# Altium footprint library Lib_001.PcbLib: 429 footprints (part 1 of 28)
Each footprint in its own frame and in the unit in brackets; x right, y up, seen from the top. Pads: shape width x height; smd on the part's side, far side on the other; paste and mask are expansions set on the pad; w line width, h text height; cw(c..) or ccw(c..) is an arc to the next point about the centre after c.
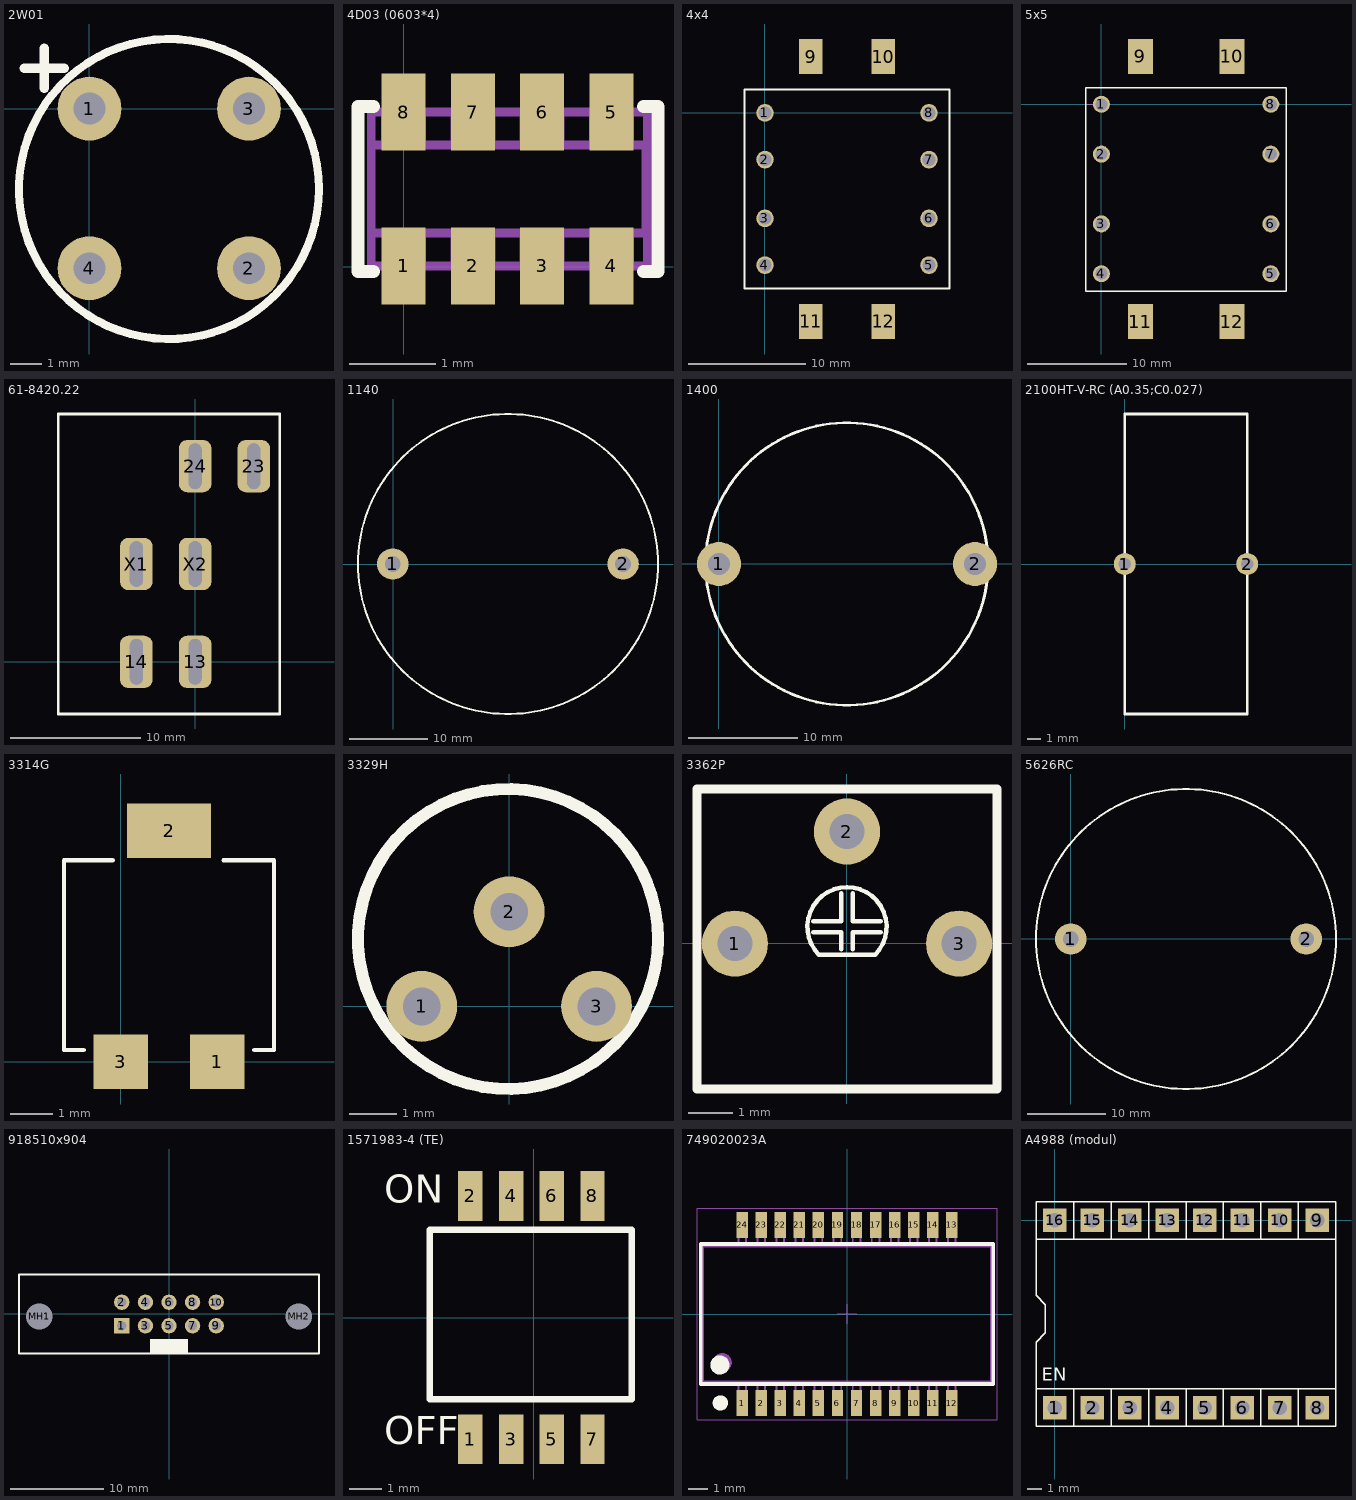
[diagram p0: the footprints below, top view; thin cyan lines are the x and y axes]

## 2W01 [mm] "Single-Phase Bridge Rectifier"
pads (4):
  round 2 hole 1: 1(0,0) 2(5,-5) 3(5,0) 4(0,-5)
Top Overlay:
  circle w0.254: c2.494,-2.518 r4.7
  lines w0.3: -2.037,1.26 -0.787,1.26 ; -1.412,0.635 -1.412,1.885
3D body "2W01.stp": height 7.4, standoff -2.6, extent -1.997,-7.004 7.003,1.996

## 4D03 (0603*4) [mil]
pads (8):
  rect 20x35 smd: 1(-0.05,0.4) 2(31.45,0.4) 3(62.95,0.4) 4(94.45,0.4) 5(94.45,70.4) 6(62.95,70.4) 7(31.45,70.4) 8(-0.05,70.4)
Top Overlay:
  lines w6: -13.8,-2.1 -20.8,-2.1 -20.8,72.9 -13.8,72.9 ; 109.1,-2.1 115.6,-2.1 115.6,72.9 109.1,72.9
Mechanical 1:
  lines w2: -15.3,-0.6 -15.3,70.4 -9.3,70.4 -9.3,55.4 9.2,55.4 9.2,71.4 22.2,71.4 22.2,55.4 40.7,55.4 40.7,71.4 53.7,71.4 53.7,55.4 72.2,55.4 72.2,71.4 85.2,71.4 85.2,55.4 103.7,55.4 103.7,71.4 110.2,71.4 110.2,-0.6 103.7,-0.6 103.7,15.4 85.2,15.4 85.2,-0.6 72.2,-0.6 72.2,15.4 53.7,15.4 53.7,-0.6 40.7,-0.6 40.7,15.4 22.2,15.4 22.2,-0.6 9.2,-0.6 9.2,15.4 -8.8,15.4 -8.8,-0.6 -15.3,-0.6
  lines w4: -14.8,0.4 -9.3,0.4 -4.3,5.4 4.2,5.4 9.2,0.4 22.2,0.4 27.2,5.4 35.7,5.4 40.7,0.4 53.7,0.4 58.7,5.4 67.2,5.4 72.2,0.4 85.2,0.4 90.2,5.4 98.7,5.4 103.7,0.4 110.7,0.4 110.7,70.4 103.7,70.4 98.7,65.4 90.2,65.4 85.2,70.4 72.2,70.4 67.2,65.4 58.7,65.4 53.7,70.4 40.7,70.4 35.7,65.4 27.2,65.4 22.2,70.4 9.2,70.4 4.2,65.4 -4.3,65.4 -9.3,70.4 -14.8,70.4 -14.8,0.4 ; -14.8,15.4 110.2,15.4 110.2,55.4 -14.8,55.4 -14.8,15.4
3D body: height 11.81, standoff 0, extent -14.8,0.4 110.7,70.4
3D body: height 13.78, standoff 11.81, extent -14.8,15.4 110.2,55.4

## 4x4 [mm] "Каркас_Ш_4х4_односекционный"
pads (12):
  round 1.5 hole 1.1 unplated: 1(0,0) 2(0,-4) 3(0,-9) 4(0,-13) 5(14,-13) 6(14,-9) 7(14,-4) 8(14,0)
  rect 2x3 smd: 9(3.91,4.8) 10(10.09,4.8) 11(3.91,-17.8) 12(10.09,-17.8)
Top Overlay:
  lines w0.15: -1.75,-15 -1.75,2 0,2 15.75,2 15.75,-15 -1.75,-15
3D body: height 12.5, standoff 0, extent -1.75,-15 15.75,2

## 5x5 [mm] "Каркас_Ш_4х4_односекционный"
pads (12):
  round 1.7 hole 1.2 unplated: 1(0,0) 2(0,-5) 3(0,-12) 4(0,-17) 5(17,-17) 6(17,-12) 7(17,-5) 8(17,0)
  rect 2.5x3.5 smd: 9(3.91,4.8) 10(13.09,4.8) 11(3.91,-21.8) 12(13.09,-21.8)
Top Overlay:
  lines w0.15: -1.569,-18.736 -1.569,1.652 2.348,1.652 18.538,1.652 18.538,-18.736 -1.569,-18.736
Mechanical 1:
  lines w0.1: -1.5,0 0,0
3D body "TR-5x5.stp": height 16, standoff -4.05, extent -1.498,-18.698 18.502,1.602

## 61-8420.22 [mm] "button"
pads (6):
  rrect50% 2.5x4 hole 1 slot 3.5 at 90 deg: 13(0,0) 14(-4.5,0) 23(4.5,15) 24(0,15) X1(-4.5,7.5) X2(0,7.5)
Top Overlay:
  lines w0.2: 6.48,-4 -10.5,-4 -10.5,19 6.48,19 ; 6.5,-4 6.5,19

## 1140 [mm]
pads (2):
  round 4 hole 2: 1(-0.033,0) 2(29.21,0)
Top Overlay:
  circle w0.254: c14.6,0 r19.05
3D body "User Library-Inductor Bourns 1140 series.STEP": height 26.16, standoff -12.7, extent -4.45,-19.05 33.65,19.05

## 1400 [mm] "1400 Series Inductor"
height 14
pads (2):
  round 4 hole 2: 1(0,0) 2(23.3,0)
Top Overlay:
  circle w0.254: c11.633,0 r12.85
3D body "User Library-murata_1400.STEP": height 14.5, standoff -10, extent -1.017,-12.2 24.283,12.2

## 2100HT-V-RC (A0.35;C0.027) [mm]
pads (2):
  round 1.6 hole 0.9: 1(0,0) 2(8.9,0)
Top Overlay:
  lines w0.2: 0,-10.9 0,0 0,10.9 8.9,10.9 8.9,0 8.9,-10.9 0,-10.9
3D body "User Library-Inductor-20uH-5A.step": height 20.89, standoff -4, extent 0.689,-10.807 8.489,10.971

## 3314G [mm]
pads (3):
  rect 1.3x1.3 smd: 1(2.3,0) 3(0,0)
  rect 2x1.3 smd: 2(1.15,5.5)
Top Overlay:
  lines w0.1: -1.35,4.78 -1.35,0.28 -0.88,0.28 ; -1.35,4.8 -0.19,4.8 ; 2.45,4.8 3.65,4.8 3.65,0.28 3.18,0.28
3D body "3314g-1-101e.stp": height 2.77, standoff 0.04, extent -1.339,-0.369 3.66,5.829

## 3329H [mm]
height 5
pads (3):
  round 1.5 hole 0.8: 1(-1.85,-0.004) 2(0,2) 3(1.85,-0.004)
Top Overlay:
  circle w0.254: c-0.025,1.422 r3.175
3D body "User Library-3329H.step": height 4.57, standoff -1.5, extent -3.179,-1.614 3.171,4.736

## 3362P [mm]
height 5
pads (3):
  round 1.5 hole 0.8: 1(-2.54,-0.004) 2(0,2.536) 3(2.54,-0.004)
Top Overlay:
  lines w0.1: -0.762,0.25 -0.127,0.25 -0.127,-0.131 ; -0.762,0.504 -0.127,0.504 -0.127,1.139 ; 0.127,-0.131 0.127,0.25 0.762,0.25 ; 0.127,1.139 0.127,0.504 0.762,0.504 ; -0.635,-0.258 cw(c0,0.377) 0.635,-0.258 -0.635,-0.258
  lines w0.2: -3.4,-3.3 3.4,-3.3 3.4,3.5 -3.4,3.5 -3.4,-3.3
3D body "User Library-R_3362P.step": height 4.65, standoff -2.85, extent -3.3,-3.584 3.3,3.406

## 5626RC [mm]
pads (2):
  round 4 hole 2: 1(0,0) 2(29.9,0)
Top Overlay:
  circle w0.254: c14.633,0 r19.05
3D body "5626-rc.stp": height 38.05, standoff -25.45, extent -4.417,-19.05 33.683,19.05

## 918510x904 [mm] "Connector; IDC, Thru-Hole; 10 Position; Vertical; Pitch 2.54 mm; Body 32.30 x 8.5 x 25.75 mm (LxWxH), Locking levers"
height 25.75
pads (12):
  rect 1.65x1.65 hole 1: 1(-5.08,-1.27)
  round 1.65 hole 1: 2(-5.08,1.27) 3(-2.54,-1.27) 4(-2.54,1.27) 5(0,-1.27) 6(0,1.27) 7(2.54,-1.27) 8(2.54,1.27) 9(5.08,-1.27) 10(5.08,1.27)
  round 2.5 hole 2.8 unplated: MH1(-13.97,-0.25) MH2(13.97,-0.25)
Top Overlay:
  rectangle: -2.05,-4.25 2.05,-2.7
  lines w0.2: -16.15,-4.25 -16.15,4.25 16.15,4.25 16.15,-4.25 -16.15,-4.25
3D body "0918_0919_SEK_male_head_str_10-pin_w_lo_lev_sld_ki_p-in.stp": height 25.74, standoff -3.21, extent -16.15,-4.25 16.15,4.25

## 1571983-4 (TE) [mm]
pads (8):
  rect 0.76x1.55 smd: 1(-1.971,-3.795) 2(-1.971,3.795) 3(-0.701,-3.795) 4(-0.701,3.795) 5(0.569,-3.795) 6(0.569,3.795) 7(1.839,-3.795) 8(1.839,3.795)
Top Overlay:
  lines w0.2: -3.233,-2.545 3.067,-2.545 3.067,2.734 -3.233,2.734 -3.233,-2.545
  text "ON" at -4.661,3.291 h1.5
  text "OFF" at -4.661,-4.247 h1.5
3D body "User Library-SW_1571983-4.step": height 2.33, standoff 0.02, extent -3.15,-4.088 3.05,4.042

## 749020023A [mm] "SMD LAN Transformers, body 15.1x7.1mm, 24-Leads"
height 4.25
pads (24):
  rect 0.6x1.35 smd: 1(-5.5,-4.675) 2(-4.5,-4.675) 3(-3.5,-4.675) 4(-2.5,-4.675) 5(-1.5,-4.675) 6(-0.5,-4.675) 7(0.5,-4.675) 8(1.5,-4.675) 9(2.5,-4.675) 10(3.5,-4.675) 11(4.5,-4.675) 12(5.5,-4.675) 13(5.5,4.675) 14(4.5,4.675) 15(3.5,4.675) 16(2.5,4.675) 17(1.5,4.675) 18(0.5,4.675) 19(-0.5,4.675) 20(-1.5,4.675) 21(-2.5,4.675) 22(-3.5,4.675) 23(-4.5,4.675) 24(-5.5,4.675)
Top Overlay:
  circle w0.5: c-6.65,-4.67 r0.15
  circle w0.5: c-6.675,-2.675 r0.25
  lines w0.2: -7.675,-3.675 7.675,-3.675 7.675,3.675 -7.675,3.675 -7.675,-3.675
Mechanical 13:
  circle w0.5: c-6.55,-2.55 r0.25
  lines w0.1: -5.7,-3.55 -5.7,-5 -5.3,-5 -5.3,-3.55 ; -5.7,3.55 -5.7,5 -5.3,5 -5.3,3.55 ; -4.7,-3.55 -4.7,-5 -4.3,-5 -4.3,-3.55 ; -4.7,3.55 -4.7,5 -4.3,5 -4.3,3.55 ; -3.7,-3.55 -3.7,-5 -3.3,-5 -3.3,-3.55 ; -3.7,3.55 -3.7,5 -3.3,5 -3.3,3.55 ; -2.7,-3.55 -2.7,-5 -2.3,-5 -2.3,-3.55 ; -2.7,3.55 -2.7,5 -2.3,5 -2.3,3.55 ; -1.7,-3.55 -1.7,-5 -1.3,-5 -1.3,-3.55 ; -1.7,3.55 -1.7,5 -1.3,5 -1.3,3.55 ; -0.7,-3.55 -0.7,-5 -0.3,-5 -0.3,-3.55 ; -0.7,3.55 -0.7,5 -0.3,5 -0.3,3.55 ; 0.3,-3.55 0.3,-5 0.7,-5 0.7,-3.55 ; 0.3,3.55 0.3,5 0.7,5 0.7,3.55 ; 1.3,-3.55 1.3,-5 1.7,-5 1.7,-3.55 ; 1.3,3.55 1.3,5 1.7,5 1.7,3.55 ; 2.3,-3.55 2.3,-5 2.7,-5 2.7,-3.55 ; 2.3,3.55 2.3,5 2.7,5 2.7,3.55 ; 3.3,-3.55 3.3,-5 3.7,-5 3.7,-3.55 ; 3.3,3.55 3.3,5 3.7,5 3.7,3.55 ; 4.3,-3.55 4.3,-5 4.7,-5 4.7,-3.55 ; 4.3,3.55 4.3,5 4.7,5 4.7,3.55 ; 5.3,-3.55 5.3,-5 5.7,-5 5.7,-3.55 ; 5.3,3.55 5.3,5 5.7,5 5.7,3.55 ; -7.55,-3.55 7.55,-3.55 7.55,3.55 -7.55,3.55 -7.55,-3.55
Mechanical 15:
  lines w0.05: -0.5,0 0.5,0 ; 0,-0.5 0,0.5 ; -7.875,-5.55 7.875,-5.55 7.875,5.55 -7.875,5.55 -7.875,-5.55
3D body "749020023A.stp": height 4, standoff 0, extent -7.551,-5 7.551,5

## A4988 (modul) [mm]
pads (16):
  rect 1.6x1.6 hole 1: 1(0,-12.7) 2(2.54,-12.7) 3(5.08,-12.7) 4(7.62,-12.7) 5(10.16,-12.7) 6(12.7,-12.7) 7(15.24,-12.7) 8(17.78,-12.7) 9(17.78,0) 10(15.24,0) 11(12.7,0) 12(10.16,0) 13(7.62,0) 14(5.08,0) 15(2.54,0) 16(0,0)
Top Overlay:
  lines w0.1: -1.27,-12.065 -1.27,-8.255 -0.635,-7.62 -0.635,-5.715 -1.27,-5.08 -1.27,-1.27 ; 19.05,-12.065 19.05,-1.27 ; -1.27,-1.27 -1.27,1.27 1.27,1.27 ; -1.27,-1.27 1.27,-1.27 ; 1.27,-13.97 3.81,-13.97 ; 1.27,-13.97 -1.27,-13.97 -1.27,-11.43 1.27,-11.43 ; 1.27,-13.97 1.27,-11.43 ; 1.27,-13.97 1.27,-11.43 ; 1.27,-11.43 3.81,-11.43 ; 1.27,-1.27 1.27,1.27 ; 1.27,-1.27 1.27,1.27 ; 1.27,-1.27 3.81,-1.27 ; 1.27,1.27 3.81,1.27 ; 3.81,-13.97 6.35,-13.97 ; 3.81,-13.97 3.81,-11.43 ; 3.81,-13.97 3.81,-11.43 ; 3.81,-11.43 6.35,-11.43 ; 3.81,-1.27 3.81,1.27 ; 3.81,-1.27 3.81,1.27 ; 3.81,-1.27 6.35,-1.27 ; 3.81,1.27 6.35,1.27 ; 6.35,-13.97 6.35,-11.43 ; 6.35,-13.97 6.35,-11.43 ; 6.35,-13.97 6.35,-11.43 ; 6.35,-13.97 8.89,-13.97 ; 6.35,-11.43 8.89,-11.43 ; 6.35,-1.27 8.89,-1.27 ; 6.35,-1.27 6.35,1.27 ; 6.35,-1.27 6.35,1.27 ; 6.35,-1.27 6.35,1.27 ; 6.35,1.27 8.89,1.27 ; 8.89,-13.97 8.89,-11.43 ; 8.89,-13.97 8.89,-11.43 ; 8.89,-13.97 11.43,-13.97 ; 8.89,-11.43 11.43,-11.43 ; 8.89,-1.27 11.43,-1.27 ; 8.89,-1.27 8.89,1.27 ; 8.89,-1.27 8.89,1.27 ; 8.89,1.27 11.43,1.27 ; 11.43,-13.97 11.43,-11.43 ; 11.43,-13.97 11.43,-11.43 ; 11.43,-13.97 13.97,-13.97 ; 11.43,-11.43 13.97,-11.43 ; 11.43,-1.27 13.97,-1.27 ; 11.43,-1.27 11.43,1.27 ; 11.43,-1.27 11.43,1.27 ; 11.43,1.27 13.97,1.27 ; 13.97,-13.97 13.97,-11.43 ; 13.97,-13.97 13.97,-11.43 ; 13.97,-13.97 16.51,-13.97 ; 13.97,-11.43 16.51,-11.43 ; 13.97,-1.27 16.51,-1.27 ; 13.97,-1.27 13.97,1.27 ; 13.97,-1.27 13.97,1.27 ; 13.97,1.27 16.51,1.27 ; 16.51,-13.97 16.51,-11.43 ; 16.51,-13.97 16.51,-11.43 ; 16.51,-13.97 19.05,-13.97 ; 16.51,-11.43 19.05,-11.43 ; 16.51,-1.27 19.05,-1.27 ; 16.51,-1.27 16.51,1.27 ; 16.51,-1.27 16.51,1.27 ; 16.51,1.27 19.05,1.27 ; 19.05,-13.97 19.05,-11.43 ; 19.05,-13.97 19.05,-11.43 ; 19.05,-1.27 19.05,1.27 ; 19.05,-1.27 19.05,1.27
  text "EN" at -0.889,-11.176 h1.52
3D body "User Library-A4988.STEP": height 13.54, standoff 3.38, extent -1.27,-13.97 19.05,1.27
3D body "User Library-PBS-01.step": height 8.4, standoff -3.2, extent 16.51,-1.27 19.05,1.27
3D body "User Library-PBS-01.step": height 8.4, standoff -3.2, extent 13.97,-1.27 16.51,1.27
3D body "User Library-PBS-01.step": height 8.4, standoff -3.2, extent 11.43,-1.27 13.97,1.27
3D body "User Library-PBS-01.step": height 8.4, standoff -3.2, extent 8.89,-1.27 11.43,1.27
3D body "User Library-PBS-01.step": height 8.4, standoff -3.2, extent 6.35,-1.27 8.89,1.27
3D body "User Library-PBS-01.step": height 8.4, standoff -3.2, extent 3.81,-1.27 6.35,1.27
3D body "User Library-PBS-01.step": height 8.4, standoff -3.2, extent 1.27,-1.27 3.81,1.27
3D body "User Library-PBS-01.step": height 8.4, standoff -3.2, extent -1.27,-1.27 1.27,1.27
3D body "User Library-PBS-01.step": height 8.4, standoff -3.2, extent -1.27,-13.97 1.27,-11.43
3D body "User Library-PBS-01.step": height 8.4, standoff -3.2, extent 1.27,-13.97 3.81,-11.43
3D body "User Library-PBS-01.step": height 8.4, standoff -3.2, extent 3.81,-13.97 6.35,-11.43
3D body "User Library-PBS-01.step": height 8.4, standoff -3.2, extent 6.35,-13.97 8.89,-11.43
3D body "User Library-PBS-01.step": height 8.4, standoff -3.2, extent 8.89,-13.97 11.43,-11.43
3D body "User Library-PBS-01.step": height 8.4, standoff -3.2, extent 11.43,-13.97 13.97,-11.43
3D body "User Library-PBS-01.step": height 8.4, standoff -3.2, extent 13.97,-13.97 16.51,-11.43
3D body "User Library-PBS-01.step": height 8.4, standoff -3.2, extent 16.51,-13.97 19.05,-11.43